# Altium footprint library IC.PcbLib: 108 footprints (part 4 of 8)
Each footprint in its own frame and in the unit in brackets; x right, y up, seen from the top. Pads: shape width x height; smd on the part's side, far side on the other; paste and mask are expansions set on the pad; w line width, h text height; cw(c..) or ccw(c..) is an arc to the next point about the centre after c.
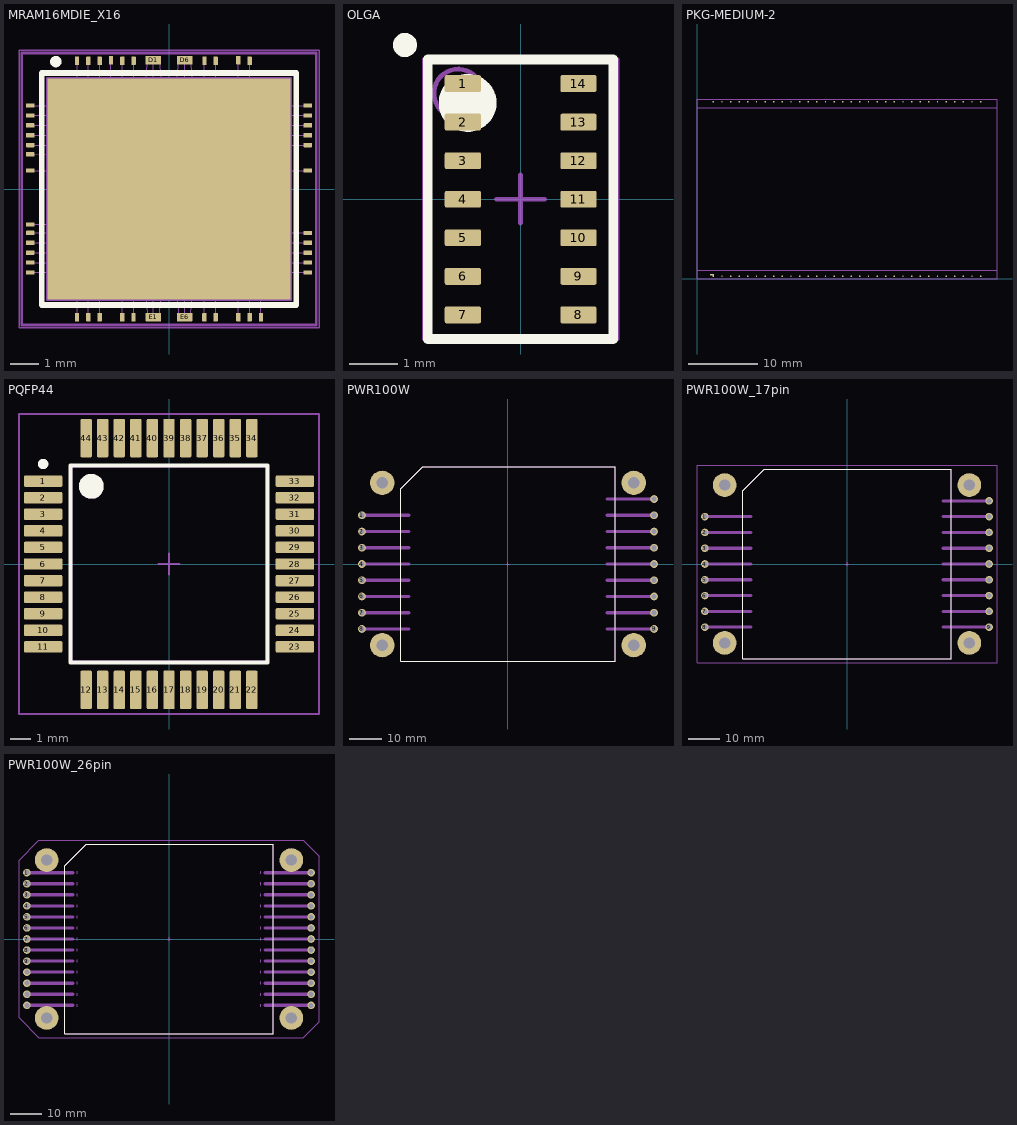
[diagram p3: the footprints below, top view; thin cyan lines are the x and y axes]

## MRAM16MDIE_X16 [mm] "MRAM16MDIE"
height 1.75
pads (201):
  rrect50% 0.15x0.15 on Mech16: 9(-3.905,-2.95) 9(-3.905,-2.6) 9(-3.905,-2.25) 9(-3.905,-1.9) 9(-3.905,-1.55) 9(-3.905,-1.25) 9(-3.905,-0.95) 9(-3.905,-0.65) 9(-3.905,-0.35) 9(-3.905,0.35) 9(-3.905,0.65) 9(-3.905,0.95) 9(-3.905,1.25) 9(-3.905,1.55) 9(-3.905,1.9) 9(-3.905,2.25) 9(-3.905,2.6) 9(-3.905,2.95) 9(-3.25,-3.53) 9(-3.25,3.53) 9(-2.85,-3.53) 9(-2.85,3.53) 9(-2.45,-3.53) 9(-2.45,3.53) 9(-2.05,-3.53) 9(-2.05,3.53) 9(-1.65,-3.53) 9(-1.65,3.53) 9(-1.25,-3.53) 9(-1.25,3.53) 9(-0.85,-3.53) 9(-0.85,3.53) 9(-0.55,-3.53) 9(-0.55,3.53) 9(-0.25,-3.53) 9(-0.25,3.53) 9(0.25,-3.53) 9(0.25,3.53) 9(0.55,-3.53) 9(0.55,3.53) 9(0.85,-3.53) 9(0.85,3.53) 9(1.25,-3.53) 9(1.25,3.53) 9(1.65,-3.53) 9(1.65,3.53) 9(2.05,-3.53) 9(2.05,3.53) 9(2.45,-3.53) 9(2.45,3.53) 9(2.85,-3.53) 9(2.85,3.53) 9(3.25,-3.53) 9(3.25,3.53) 9(3.905,-2.95) 9(3.905,-2.6) 9(3.905,-2.25) 9(3.905,-1.9) 9(3.905,-1.55) 9(3.905,-1.25) 9(3.905,-0.95) 9(3.905,-0.65) 9(3.905,-0.35) 9(3.905,0.35) 9(3.905,0.65) 9(3.905,0.95) 9(3.905,1.25) 9(3.905,1.55) 9(3.905,1.9) 9(3.905,2.25) 9(3.905,2.6) 9(3.905,2.95)
  rrect20% 0.15x0.3 smd paste-0.15: A1(-3.25,4.529) B1(2.85,4.529) B5(-3.25,-4.53) B6(-2.85,-4.53) C1(2.45,4.55) C2(1.65,4.529) C5(-2.45,-4.529) C6(-1.65,-4.53) D1(-0.75,4.55) D1(-0.35,4.55) D2(1.25,4.529) D5(-1.25,-4.53) D6(0.35,4.55) D6(0.75,4.55) E1(-0.75,-4.525) E1(-0.35,-4.525) E2(-1.25,4.529) E5(1.25,-4.529) E6(0.35,-4.525) E6(0.75,-4.525) F1(-2.45,4.529) F2(-2.05,4.55) F2(-1.65,4.529) F5(1.65,-4.529) F6(2.45,-4.53) G1(-2.85,4.529) G5(3.25,-4.53) G6(2.85,-4.529)
  rrect20% 0.3x0.15 smd paste-0.15: A2(-4.905,2.6) A3(-4.905,-1.55) A4(-4.905,-1.9) A5(-4.905,-2.25) B3(-4.905,-2.6) B4(-4.905,-2.95) C3(4.904,-2.95) C4(4.909,-2.6) D3(-4.905,1.55) D4(4.904,-2.25) E4(-4.905,1.9) E6(-4.905,0.65) E6(4.905,0.65) F3(4.904,2.95) F4(-4.905,2.25) G3(4.904,2.25) G4(4.9,2.6) H1(-4.905,1.226) H2(4.904,-1.9) H3(4.904,-1.55) H4(4.904,1.55) H5(4.904,1.9) H6(-4.9,-1.25)
  rrect20% 0.3x0.15 smd: B2(-4.905,2.95)
  rrect20% 0.45x0.3 smd paste-0.15: D1(-0.55,4.55) D6(0.55,4.55) E1(-0.55,-4.525) E6(0.55,-4.525)
  rrect25% 0.12x0.12 on Mech13: ""(-3.909,2.6) ""(-3.905,-2.95) ""(-3.905,-2.25) ""(-3.905,-1.9) ""(-3.905,-1.55) ""(-3.905,-1.25) ""(-3.905,-0.95) ""(-3.905,-0.65) ""(-3.905,-0.35) ""(-3.905,0.35) ""(-3.905,0.65) ""(-3.905,0.95) ""(-3.905,1.25) ""(-3.905,1.55) ""(-3.905,1.9) ""(-3.905,2.25) ""(-3.905,2.95) ""(-3.9,-2.6) ""(-3.25,-3.53) ""(-3.25,3.53) ""(-2.85,-3.53) ""(-2.85,3.53) ""(-2.45,-3.53) ""(-2.45,3.53) ""(-2.05,-3.53) ""(-2.05,3.53) ""(-1.65,-3.53) ""(-1.65,3.53) ""(-1.25,-3.53) ""(-1.25,3.53) ""(-0.85,-3.53) ""(-0.85,3.53) ""(-0.55,-3.53) ""(-0.55,3.53) ""(-0.25,-3.53) ""(-0.25,3.53) ""(0.25,-3.53) ""(0.25,3.53) ""(0.55,-3.53) ""(0.55,3.53) ""(0.85,-3.53) ""(0.85,3.53) ""(1.25,-3.53) ""(1.25,3.53) ""(1.65,-3.53) ""(1.65,3.53) ""(2.05,-3.53) ""(2.05,3.53) ""(2.45,-3.53) ""(2.45,3.53) ""(2.85,-3.53) ""(2.85,3.53) ""(3.25,-3.53) ""(3.25,3.53) ""(3.9,2.6) ""(3.905,-2.95) ""(3.905,-2.25) ""(3.905,-1.9) ""(3.905,-1.55) ""(3.905,-1.25) ""(3.905,-0.95) ""(3.905,-0.65) ""(3.905,-0.35) ""(3.905,0.35) ""(3.905,0.65) ""(3.905,0.95) ""(3.905,1.25) ""(3.905,1.55) ""(3.905,1.9) ""(3.905,2.25) ""(3.905,2.95) ""(3.909,-2.6)
  rect 8.6x7.8 smd: ""(0,0)
Top Overlay:
  circle w0.2: c-4,4.5 r0.1
  lines w0.2: -4.5,-4.1 4.5,-4.1 4.5,4.1 -4.5,4.1 -4.5,-4.1
M3_comm_top:
  text ".comment" at 0,0 h1
M5_asm_top:
  circle w0.15: c-4,4.5 r0.1
  lines w0.1: -4.5,-4.1 -4.5,4.1 4.5,4.1 4.5,-4.1 -4.5,-4.1
  text ".Designator" at -2,5 h1
M7_courtyard_top:
  lines w0.1: -0.5,0 0.5,0 ; 0,-0.5 0,0.5 ; -5.2,-4.8 -5.2,4.8 5.2,4.8 5.2,-4.8 -5.2,-4.8
Mechanical 13:
  circle w0.1: c-4,3.6 r0.1
  lines w0.01: -4.905,-2.95 -3.91,-2.95 ; -4.905,-2.6 -3.91,-2.6 ; -4.905,-2.25 -3.91,-2.25 ; -4.905,-1.902 -3.91,-1.902 ; -4.905,-1.55 -3.91,-1.55 ; -4.905,-1.25 -3.91,-1.25 ; -4.905,0.65 -3.91,0.65 ; -4.905,1.9 -3.91,1.9 ; -4.905,2.6 -3.91,2.6 ; -4.905,2.95 -3.91,2.95 ; -4.9,1.55 -3.905,1.55 ; -4.9,2.25 -3.905,2.25 ; -4.89,1.226 -3.905,1.243 ; -3.25,-4.53 -3.25,-3.53 ; -3.25,3.529 -3.25,4.529 ; -2.85,-4.53 -2.85,-3.53 ; -2.85,3.529 -2.85,4.529 ; -2.45,-4.529 -2.45,-3.529 ; -2.45,3.529 -2.45,4.529 ; -2.05,3.53 -2.05,4.55 ; -1.65,-4.529 -1.65,-3.529 ; -1.65,3.529 -1.65,4.529 ; -1.25,-4.529 -1.25,-3.529 ; -1.25,3.529 -1.25,4.529 ; -0.85,-3.53 -0.75,-4.525 ; -0.85,3.53 -0.75,4.55 ; -0.55,-4.53 -0.55,-3.53 ; -0.55,3.53 -0.55,4.55 ; -0.35,-4.525 -0.25,-3.53 ; -0.35,4.55 -0.25,3.53 ; 0.25,-3.53 0.35,-4.525 ; 0.25,3.53 0.35,4.55 ; 0.55,-4.53 0.55,-3.53 ; 0.55,3.53 0.55,4.55 ; 0.75,-4.525 0.85,-3.53 ; 0.75,4.55 0.85,3.53 ; 1.25,-4.529 1.25,-3.529 ; 1.25,3.529 1.25,4.529 ; 1.65,-4.529 1.65,-3.529 ; 1.65,3.529 1.65,4.529 ; 2.45,-4.53 2.45,-3.53 ; 2.45,3.53 2.45,4.55 ; 2.85,-4.529 2.85,-3.529 ; 2.85,3.529 2.85,4.529 ; 3.25,-4.53 3.25,-3.53 ; 3.899,2.6 4.9,2.6 ; 3.904,-2.95 4.904,-2.95 ; 3.904,-2.25 4.904,-2.25 ; 3.904,-1.9 4.904,-1.9 ; 3.904,-1.55 4.904,-1.55 ; 3.905,0.65 4.905,0.65 ; 3.904,1.55 4.904,1.55 ; 3.904,1.9 4.904,1.9 ; 3.904,2.25 4.904,2.25 ; 3.904,2.95 4.904,2.95 ; 3.909,-2.6 4.909,-2.6 ; -1.175,1.325 -1.175,1.6 1.175,1.6 1.175,1.325 ; -1.175,1.325 -1.175,0.65 1.175,0.65 1.175,1.325 ; -1.175,1.325 1.175,1.325
  lines w0.1: -4.3,-3.9 4.3,-3.9 4.3,3.9 -4.3,3.9 -4.3,-3.9
  text "dq" at 1.7,-3.454 h0.2
  text "dq" at 2.9,-3.429 h0.2
  text "dq" at 2.5,-3.429 h0.2
  text "dq" at 2.9,3.175 h0.2
  text "dq" at 2.5,3.176 h0.2
  text "dq" at 1.7,3.176 h0.2
  text "dq" at 1.3,3.175 h0.2
  text "dq" at -1.6,3.175 h0.2
  text "dql1" at -2.4,-3.45 h0.2
  text "dq" at -2.8,-3.45 h0.2
  text "X16" at 0.325,1.15 h0.2
  text "X8 BGA" at 0.325,0.95 h0.2
  text "X8 TSOP" at 0.325,0.75 h0.2
  text "1" at -0.85,0.75 h0.2
  text "0" at -0.175,0.75 h0.2
  text "0" at -0.85,0.95 h0.2
  text "1" at -0.175,0.95 h0.2
  text "0" at -0.85,1.15 h0.2
  text "0" at -0.175,1.15 h0.2
  text "bgax8" at -0.375,1.4 h0.2
  text "tsopx8" at -1.05,1.4 h0.2
  text "vddl" at -2,-3.45 h0.2
  text "ce2b" at -3.824,-1 h0.2
  text "nc_left1" at -3.824,-0.7 h0.2
  text "nc_left0" at -3.824,-0.4 h0.2
  text "vss_x8bga" at -3.824,0.3 h0.2
  text "vdd_x8bga" at -3.824,0.9 h0.2
  text "9" at -3.275,3.625 h0.2
  text "vdd" at 0.9,3.175 h0.2
  text "vdd" at 0.6,3.175 h0.2
  text "vdd" at 0.3,3.175 h0.2
  text "a14" at 3.525,2.875 h0.2
  text "a13" at 3.525,2.525 h0.2
  text "a12" at 3.525,2.175 h0.2
  text "a11" at 3.525,1.825 h0.2
  text "a10" at 3.525,1.475 h0.2
  text "vss" at 0.9,-3.45 h0.2
  text "vss" at 0.6,-3.45 h0.2
  text "vss" at 0.3,-3.45 h0.2
  text "vdd" at -0.2,-3.45 h0.2
  text "vdd" at -0.5,-3.45 h0.2
  text "vdd" at -0.8,-3.45 h0.2
  text "dq" at -1.2,-3.45 h0.2
  text "dq" at -1.6,-3.45 h0.2
  text "en" at -3.2,-3.45 h0.2
  text "a4" at -3.825,-3 h0.2
  text "a3" at -3.825,-2.65 h0.2
  text "a2" at -3.825,-2.3 h0.2
  text "a1" at -3.825,-1.95 h0.2
  text "a0" at -3.825,-1.6 h0.2
  text "a19" at -3.825,-1.3 h0.2
  text "bgax8" at -3.825,0.6 h0.2
  text "a18" at -3.825,1.2 h0.2
  text "a17" at -3.825,1.5 h0.2
  text "a16" at -3.825,1.85 h0.2
  text "a15" at -3.825,2.2 h0.2
  text "ng" at -3.825,2.55 h0.2
  text "dq" at -2.8,3.175 h0.2
  text "vss" at -0.2,3.175 h0.2
  text "vss" at -0.5,3.175 h0.2
  text "vss" at -0.8,3.175 h0.2
  text "dq" at -1.2,3.175 h0.2
  text "dq" at -2.4,3.175 h0.2
  text "dq" at 1.3,-3.45 h0.2
  text "w" at 3.3,-3.45 h0.2
  text "a5" at 3.625,-3.025 h0.2
  text "a6" at 3.625,-2.675 h0.2
  text "a7" at 3.625,-2.325 h0.2
  text "a8" at 3.625,-1.975 h0.2
  text "a9" at 3.625,-1.625 h0.2
  text "tsopx8" at 3.275,0.6 h0.2
  text "1" at -0.275,3.625 h0.2
  text "2" at -0.575,3.625 h0.2
  text "3" at -0.875,3.625 h0.2
  text "4" at -1.275,3.625 h0.2
  text "5" at -1.675,3.625 h0.2
  text "6" at -2.075,3.625 h0.2
  text "7" at -2.475,3.625 h0.2
  text "8" at -2.875,3.625 h0.2
  text "10" at -4.175,2.875 h0.2
  text "11" at -4.175,2.525 h0.2
  text "12" at -4.175,2.175 h0.2
  text "13" at -4.175,1.825 h0.2
  text "14" at -4.175,1.475 h0.2
  text "15" at -4.175,1.175 h0.2
  text "16" at -4.175,0.875 h0.2
  text "17" at -4.175,0.575 h0.2
  text "18" at -4.175,0.275 h0.2
  text "19" at -4.175,-0.425 h0.2
  text "20" at -4.175,-0.725 h0.2
  text "21" at -4.175,-1.025 h0.2
  text "22" at -4.175,-1.325 h0.2
  text "23" at -4.175,-1.625 h0.2
  text "24" at -4.175,-1.975 h0.2
  text "25" at -4.175,-2.325 h0.2
  text "26" at -4.175,-2.675 h0.2
  text "27" at -4.175,-3.025 h0.2
  text "28" at -3.345,-3.75 h0.2
  text "29" at -2.945,-3.75 h0.2
  text "30" at -2.545,-3.75 h0.2
  text "31" at -2.145,-3.75 h0.2
  text "32" at -1.745,-3.75 h0.2
  text "33" at -1.345,-3.75 h0.2
  text "34" at -0.945,-3.75 h0.2
  text "35" at -0.645,-3.75 h0.2
  text "36" at -0.345,-3.75 h0.2
  text "37" at 0.155,-3.75 h0.2
  text "38" at 0.455,-3.75 h0.2
  text "39" at 0.755,-3.75 h0.2
  text "40" at 1.155,-3.75 h0.2
  text "41" at 1.555,-3.75 h0.2
  text "42" at 1.955,-3.75 h0.2
  text "43" at 2.355,-3.75 h0.2
  text "44" at 2.755,-3.75 h0.2
  text "45" at 3.155,-3.75 h0.2
  text "46" at 4,-3.025 h0.2
  text "47" at 4,-2.675 h0.2
  text "48" at 4,-2.325 h0.2
  text "49" at 4,-1.975 h0.2
  text "50" at 4,-1.625 h0.2
  text "51" at 4,-1.325 h0.2
  text "52" at 4,-1.025 h0.2
  text "53" at 4,-0.725 h0.2
  text "54" at 4,-0.425 h0.2
  text "55" at 4,0.275 h0.2
  text "56" at 4,0.575 h0.2
  text "57" at 4,0.875 h0.2
  text "58" at 4,1.175 h0.2
  text "59" at 4,1.475 h0.2
  text "60" at 4,1.825 h0.2
  text "61" at 4,2.175 h0.2
  text "62" at 4,2.525 h0.2
  text "63" at 4,2.875 h0.2
  text "72" at 0.15,3.625 h0.2
  text "71" at 0.45,3.625 h0.2
  text "70" at 0.75,3.625 h0.2
  text "69" at 1.15,3.625 h0.2
  text "68" at 1.55,3.625 h0.2
  text "67" at 1.95,3.625 h0.2
  text "66" at 2.35,3.625 h0.2
  text "65" at 2.75,3.625 h0.2
  text "64" at 3.15,3.625 h0.2
  text "slp" at -2,3.175 h0.2
  text "nUB" at -3.82,2.9 h0.2
  text "nLB" at -3.2,3.15 h0.2
  text "nc_bot" at 2.1,-3.45 h0.2
  text "dbd_b_DC(/ED)" at 2.55,-1.3 h0.2
  text "lvl" at 3.625,-1.025 h0.2
  text "vdd_bot" at 3.175,-0.7 h0.2
  text "opt_bot" at 3.175,-0.4 h0.2
  text "vdd_x8tsop" at 2.9,0.3 h0.2
  text "vss_tsopx8" at 2.899,0.915 h0.2
  text "nc_right" at 3.175,1.2 h0.2
  text "vddl" at 2.1,3.125 h0.2
Mechanical 15:
  lines w0.05: -5.3,-4.9 -5.3,4.9 5.3,4.9 5.3,-4.9 -5.3,-4.9
  lines w0.1: -0.5,0 0.5,0 ; 0,-0.5 0,0.5
3D body: height 0.5, standoff 0.46, extent -4.914,0.635 -4.884,0.665
3D body: height 0.48, standoff 0, extent -4.914,0.635 -4.885,0.665
3D body: height 0.5, standoff 0.47, extent -4.9,0.635 -3.85,0.665
3D body: height 0.48, standoff 0, extent -3.265,4.514 -3.235,4.544
3D body: height 0.5, standoff 0.46, extent -3.265,4.514 -3.235,4.544
3D body: height 0.5, standoff 0.47, extent -3.265,3.53 -3.235,4.53
3D body: height 0.48, standoff 0, extent -2.865,4.514 -2.835,4.544
3D body: height 0.5, standoff 0.46, extent -2.865,4.514 -2.835,4.544
3D body: height 0.5, standoff 0.47, extent -2.865,3.53 -2.835,4.53
3D body: height 0.48, standoff 0, extent -2.465,4.514 -2.435,4.544
3D body: height 0.5, standoff 0.46, extent -2.465,4.514 -2.435,4.544
3D body: height 0.5, standoff 0.47, extent -2.465,3.53 -2.435,4.53
3D body: height 0.48, standoff 0, extent -1.665,4.514 -1.635,4.544
3D body: height 0.5, standoff 0.46, extent -1.665,4.514 -1.635,4.544
3D body: height 0.5, standoff 0.47, extent -1.665,3.53 -1.635,4.53
3D body: height 0.48, standoff 0, extent -1.265,4.514 -1.235,4.544
3D body: height 0.5, standoff 0.46, extent -1.265,4.514 -1.235,4.544
3D body: height 0.5, standoff 0.47, extent -1.265,3.53 -1.235,4.53
3D body: height 0.48, standoff 0, extent 1.235,4.514 1.265,4.544
3D body: height 0.5, standoff 0.46, extent 1.235,4.514 1.265,4.544
3D body: height 0.5, standoff 0.47, extent 1.235,3.53 1.265,4.53
3D body: height 0.48, standoff 0, extent 1.635,4.514 1.665,4.544
3D body: height 0.5, standoff 0.46, extent 1.635,4.514 1.665,4.544
3D body: height 0.5, standoff 0.47, extent 1.635,3.53 1.665,4.53
3D body: height 0.48, standoff 0, extent 2.835,4.514 2.865,4.544
3D body: height 0.5, standoff 0.46, extent 2.835,4.514 2.865,4.544
3D body: height 0.5, standoff 0.47, extent 2.835,3.53 2.865,4.53
3D body: height 0.48, standoff 0, extent 4.889,2.935 4.919,2.965
3D body: height 0.5, standoff 0.46, extent 4.889,2.935 4.919,2.965
3D body: height 0.5, standoff 0.47, extent 3.905,2.935 4.905,2.965
3D body: height 0.48, standoff 0, extent 4.885,2.585 4.915,2.615
3D body: height 0.5, standoff 0.46, extent 4.885,2.585 4.915,2.615
3D body: height 0.5, standoff 0.47, extent 3.9,2.585 4.9,2.615
3D body: height 0.48, standoff 0, extent 4.889,2.235 4.919,2.265
3D body: height 0.5, standoff 0.46, extent 4.889,2.235 4.919,2.265
3D body: height 0.5, standoff 0.47, extent 3.905,2.235 4.905,2.265
3D body: height 0.48, standoff 0, extent 4.889,1.885 4.919,1.915
3D body: height 0.5, standoff 0.46, extent 4.889,1.885 4.919,1.915
3D body: height 0.5, standoff 0.47, extent 3.905,1.885 4.905,1.915
3D body: height 0.48, standoff 0, extent 4.889,1.535 4.919,1.565
3D body: height 0.5, standoff 0.46, extent 4.889,1.535 4.919,1.565
3D body: height 0.5, standoff 0.47, extent 3.905,1.535 4.905,1.565
3D body: height 0.48, standoff 0, extent 4.889,-1.565 4.919,-1.535
3D body: height 0.5, standoff 0.46, extent 4.889,-1.565 4.919,-1.535
3D body: height 0.5, standoff 0.47, extent 3.905,-1.565 4.905,-1.535
3D body: height 0.48, standoff 0, extent 4.889,-1.915 4.919,-1.885
3D body: height 0.5, standoff 0.46, extent 4.889,-1.915 4.919,-1.885
3D body: height 0.5, standoff 0.47, extent 3.905,-1.915 4.905,-1.885
3D body: height 0.48, standoff 0, extent 4.889,-2.265 4.919,-2.235
3D body: height 0.5, standoff 0.46, extent 4.889,-2.265 4.919,-2.235
3D body: height 0.5, standoff 0.47, extent 3.905,-2.265 4.905,-2.235
3D body: height 0.48, standoff 0, extent 4.894,-2.615 4.924,-2.585
3D body: height 0.5, standoff 0.46, extent 4.894,-2.615 4.924,-2.585
3D body: height 0.5, standoff 0.47, extent 3.909,-2.615 4.909,-2.585
3D body: height 0.48, standoff 0, extent 4.889,-2.965 4.919,-2.935
3D body: height 0.5, standoff 0.46, extent 4.889,-2.965 4.919,-2.935
3D body: height 0.5, standoff 0.47, extent 3.905,-2.965 4.905,-2.935
3D body: height 0.48, standoff 0, extent 2.835,-4.544 2.865,-4.514
3D body: height 0.5, standoff 0.46, extent 2.835,-4.544 2.865,-4.514
3D body: height 0.5, standoff 0.47, extent 2.835,-4.53 2.865,-3.53
3D body: height 0.48, standoff 0, extent 1.235,-4.544 1.265,-4.514
3D body: height 0.5, standoff 0.46, extent 1.235,-4.544 1.265,-4.514
3D body: height 0.5, standoff 0.47, extent 1.235,-4.53 1.265,-3.53
3D body: height 0.48, standoff 0, extent 1.635,-4.544 1.665,-4.514
3D body: height 0.5, standoff 0.46, extent 1.635,-4.544 1.665,-4.514
3D body: height 0.5, standoff 0.47, extent 1.635,-4.53 1.665,-3.53
3D body: height 0.48, standoff 0, extent -1.265,-4.544 -1.235,-4.514
3D body: height 0.5, standoff 0.46, extent -1.265,-4.544 -1.235,-4.514
3D body: height 0.5, standoff 0.47, extent -1.265,-4.53 -1.235,-3.53
3D body: height 0.48, standoff 0, extent -1.665,-4.544 -1.635,-4.514
3D body: height 0.5, standoff 0.46, extent -1.665,-4.544 -1.635,-4.514
3D body: height 0.5, standoff 0.47, extent -1.665,-4.53 -1.635,-3.53
3D body: height 0.48, standoff 0, extent -2.465,-4.544 -2.435,-4.514
3D body: height 0.5, standoff 0.46, extent -2.465,-4.544 -2.435,-4.514
3D body: height 0.5, standoff 0.47, extent -2.465,-4.53 -2.435,-3.53
3D body: height 0.5, standoff 0.47, extent -2.865,-4.53 -2.835,-3.53
3D body: height 0.5, standoff 0.46, extent -2.865,-4.545 -2.835,-4.515
3D body: height 0.48, standoff 0, extent -2.865,-4.545 -2.835,-4.515
3D body: height 0.5, standoff 0.46, extent -4.915,-2.965 -4.885,-2.935
3D body: height 0.48, standoff 0, extent -4.915,-2.965 -4.885,-2.935
3D body: height 0.5, standoff 0.47, extent -4.9,-2.965 -3.85,-2.935
3D body: height 0.5, standoff 0.46, extent -4.915,-2.615 -4.885,-2.585
3D body: height 0.48, standoff 0, extent -4.915,-2.615 -4.885,-2.585
3D body: height 0.5, standoff 0.47, extent -4.9,-2.615 -3.85,-2.585
3D body: height 0.5, standoff 0.46, extent -4.915,-2.265 -4.885,-2.235
3D body: height 0.48, standoff 0, extent -4.915,-2.265 -4.885,-2.235
3D body: height 0.5, standoff 0.47, extent -4.9,-2.265 -3.85,-2.235
3D body: height 0.5, standoff 0.46, extent -4.915,-1.917 -4.885,-1.887
3D body: height 0.48, standoff 0, extent -4.915,-1.917 -4.885,-1.887
3D body: height 0.5, standoff 0.47, extent -4.9,-1.917 -3.85,-1.887
3D body: height 0.5, standoff 0.46, extent -4.915,-1.565 -4.885,-1.535
3D body: height 0.48, standoff 0, extent -4.915,-1.565 -4.885,-1.535
3D body: height 0.5, standoff 0.47, extent -4.9,-1.565 -3.85,-1.535
3D body: height 0.5, standoff 0.46, extent -4.915,-1.265 -4.885,-1.235
3D body: height 0.48, standoff 0, extent -4.915,-1.265 -4.885,-1.235
3D body: height 0.5, standoff 0.47, extent -4.9,-1.265 -3.85,-1.235
3D body: height 0.5, standoff 0.47, extent -4.906,1.535 -3.856,1.565
3D body: height 0.48, standoff 0, extent -4.92,1.535 -4.89,1.565
3D body: height 0.5, standoff 0.46, extent -4.92,1.535 -4.89,1.565
3D body: height 0.5, standoff 0.47, extent -4.906,1.885 -3.856,1.915
3D body: height 0.48, standoff 0, extent -4.92,1.885 -4.89,1.915
3D body: height 0.5, standoff 0.46, extent -4.92,1.885 -4.89,1.915
3D body: height 0.5, standoff 0.47, extent -4.906,2.235 -3.856,2.265
3D body: height 0.48, standoff 0, extent -4.92,2.235 -4.89,2.265
3D body: height 0.5, standoff 0.46, extent -4.92,2.235 -4.89,2.265
3D body: height 0.5, standoff 0.47, extent -4.906,2.585 -3.856,2.615
3D body: height 0.48, standoff 0, extent -4.92,2.585 -4.89,2.615
3D body: height 0.5, standoff 0.46, extent -4.92,2.585 -4.89,2.615
3D body: height 0.5, standoff 0.47, extent -4.906,2.935 -3.856,2.965
3D body: height 0.48, standoff 0, extent -4.92,2.935 -4.89,2.965
3D body: height 0.5, standoff 0.46, extent -4.92,2.935 -4.89,2.965
3D body: height 0.49, standoff 0.46, extent 0.735,3.504 0.875,4.552
3D body: height 0.5, standoff 0.47, extent 0.535,3.5 0.565,4.55
3D body: height 0.4, standoff 0, extent -4.3,-3.9 4.3,3.9
3D body: height 0.48, standoff 0, extent -2.065,4.535 -2.035,4.565
3D body: height 0.5, standoff 0.46, extent -2.065,4.535 -2.035,4.565
3D body: height 0.48, standoff 0, extent -0.765,4.535 -0.735,4.565
3D body: height 0.5, standoff 0.46, extent -0.765,4.535 -0.735,4.565
3D body: height 0.48, standoff 0, extent -0.565,4.535 -0.535,4.565
3D body: height 0.5, standoff 0.46, extent -0.565,4.535 -0.535,4.565
3D body: height 0.48, standoff 0, extent -0.365,4.535 -0.335,4.565
3D body: height 0.5, standoff 0.46, extent -0.365,4.535 -0.335,4.565
3D body: height 0.5, standoff 0.46, extent 0.335,4.535 0.365,4.565
3D body: height 0.48, standoff 0, extent 0.335,4.535 0.365,4.565
3D body: height 0.5, standoff 0.46, extent 0.535,4.535 0.565,4.565
3D body: height 0.48, standoff 0, extent 0.535,4.535 0.565,4.565
3D body: height 0.5, standoff 0.46, extent 0.735,4.535 0.765,4.565
3D body: height 0.48, standoff 0, extent 0.735,4.535 0.765,4.565
3D body: height 0.5, standoff 0.46, extent 2.435,4.535 2.465,4.565
3D body: height 0.48, standoff 0, extent 2.435,4.535 2.465,4.565
3D body: height 0.48, standoff 0, extent 4.89,0.635 4.92,0.665
3D body: height 0.47, standoff 0.46, extent 3.842,-3.012 3.967,-2.887
3D body: height 0.47, standoff 0.46, extent 3.847,-2.662 3.972,-2.537
3D body: height 0.47, standoff 0.46, extent 3.842,-2.312 3.967,-2.187
3D body: height 0.47, standoff 0.46, extent 3.842,-1.962 3.967,-1.837
3D body: height 0.47, standoff 0.46, extent 3.842,-1.612 3.967,-1.487
3D body: height 0.47, standoff 0.46, extent 3.842,-1.312 3.967,-1.187
3D body: height 0.47, standoff 0.46, extent 3.842,-1.012 3.967,-0.887
3D body: height 0.47, standoff 0.46, extent 3.842,-0.712 3.967,-0.587
3D body: height 0.47, standoff 0.46, extent 3.842,-0.412 3.967,-0.287
3D body: height 0.47, standoff 0.46, extent 3.842,0.288 3.967,0.413
3D body: height 0.47, standoff 0.46, extent 3.842,0.588 3.967,0.713
3D body: height 0.47, standoff 0.46, extent 3.842,0.888 3.967,1.013
3D body: height 0.47, standoff 0.46, extent 3.842,1.188 3.967,1.313
3D body: height 0.47, standoff 0.46, extent 3.842,1.488 3.967,1.613
3D body: height 0.47, standoff 0.46, extent 3.842,1.838 3.967,1.963
3D body: height 0.47, standoff 0.46, extent 3.842,2.188 3.967,2.313
3D body: height 0.47, standoff 0.46, extent 3.838,2.538 3.963,2.663
3D body: height 0.47, standoff 0.46, extent 3.842,2.888 3.967,3.013
3D body: height 0.47, standoff 0.46, extent 3.188,3.467 3.313,3.592
3D body: height 0.47, standoff 0.46, extent 2.788,3.467 2.913,3.592
3D body: height 0.47, standoff 0.46, extent 2.388,3.467 2.513,3.592
3D body: height 0.47, standoff 0.46, extent 1.988,3.467 2.113,3.592
3D body: height 0.47, standoff 0.46, extent 1.588,3.467 1.713,3.592
3D body: height 0.47, standoff 0.46, extent 1.188,3.467 1.313,3.592
3D body: height 0.47, standoff 0.46, extent 0.788,3.467 0.913,3.592
3D body: height 0.47, standoff 0.46, extent 0.488,3.467 0.613,3.592
3D body: height 0.47, standoff 0.46, extent 0.188,3.467 0.313,3.592
3D body: height 0.47, standoff 0.46, extent -0.312,3.467 -0.187,3.592
3D body: height 0.47, standoff 0.46, extent -0.612,3.467 -0.487,3.592
3D body: height 0.47, standoff 0.46, extent -0.912,3.467 -0.787,3.592
3D body: height 0.47, standoff 0.46, extent -1.312,3.467 -1.187,3.592
3D body: height 0.47, standoff 0.46, extent -1.712,3.467 -1.587,3.592
3D body: height 0.47, standoff 0.46, extent -3.312,3.467 -3.187,3.592
3D body: height 0.47, standoff 0.46, extent -2.512,3.467 -2.387,3.592
3D body: height 0.47, standoff 0.46, extent -2.912,3.467 -2.787,3.592
3D body: height 0.47, standoff 0.46, extent -2.112,3.467 -1.987,3.592
3D body: height 0.47, standoff 0.46, extent -3.967,2.888 -3.842,3.013
3D body: height 0.47, standoff 0.46, extent -3.972,2.538 -3.847,2.663
3D body: height 0.47, standoff 0.46, extent -3.967,2.188 -3.842,2.313
3D body: height 0.47, standoff 0.46, extent -3.967,1.838 -3.842,1.963
3D body: height 0.47, standoff 0.46, extent -3.967,1.488 -3.842,1.613
3D body: height 0.47, standoff 0.46, extent -3.967,1.188 -3.842,1.313
3D body: height 0.47, standoff 0.46, extent -3.967,0.888 -3.842,1.013
3D body: height 0.47, standoff 0.46, extent -3.967,0.588 -3.842,0.713
3D body: height 0.47, standoff 0.46, extent -3.967,0.288 -3.842,0.413
3D body: height 0.47, standoff 0.46, extent -3.967,-0.412 -3.842,-0.287
3D body: height 0.47, standoff 0.46, extent -3.967,-0.712 -3.842,-0.587
3D body: height 0.47, standoff 0.46, extent -3.967,-1.012 -3.842,-0.887
3D body: height 0.47, standoff 0.46, extent -3.967,-1.312 -3.842,-1.187
3D body: height 0.47, standoff 0.46, extent -3.967,-1.612 -3.842,-1.487
3D body: height 0.47, standoff 0.46, extent -3.967,-1.962 -3.842,-1.837
3D body: height 0.47, standoff 0.46, extent -3.967,-2.312 -3.842,-2.187
3D body: height 0.47, standoff 0.46, extent -3.967,-2.662 -3.842,-2.537
3D body: height 0.47, standoff 0.46, extent -3.967,-3.012 -3.842,-2.887
3D body: height 0.47, standoff 0.46, extent -3.312,-3.592 -3.187,-3.467
3D body: height 0.47, standoff 0.46, extent -2.912,-3.592 -2.787,-3.467
3D body: height 0.47, standoff 0.46, extent -2.512,-3.592 -2.387,-3.467
3D body: height 0.47, standoff 0.46, extent -2.112,-3.592 -1.987,-3.467
3D body: height 0.47, standoff 0.46, extent -1.712,-3.592 -1.587,-3.467
3D body: height 0.47, standoff 0.46, extent -1.312,-3.592 -1.187,-3.467
3D body: height 0.47, standoff 0.46, extent -0.912,-3.592 -0.787,-3.467
3D body: height 0.47, standoff 0.46, extent -0.612,-3.592 -0.487,-3.467
3D body: height 0.47, standoff 0.46, extent -0.312,-3.592 -0.187,-3.467
3D body: height 0.47, standoff 0.46, extent 0.188,-3.592 0.313,-3.467
3D body: height 0.47, standoff 0.46, extent 0.488,-3.592 0.613,-3.467
3D body: height 0.47, standoff 0.46, extent 0.788,-3.592 0.913,-3.467
3D body: height 0.47, standoff 0.46, extent 1.188,-3.592 1.313,-3.467
3D body: height 0.47, standoff 0.46, extent 1.588,-3.592 1.713,-3.467
3D body: height 0.47, standoff 0.46, extent 1.988,-3.592 2.113,-3.467
3D body: height 0.47, standoff 0.46, extent 2.388,-3.592 2.513,-3.467
3D body: height 0.47, standoff 0.46, extent 2.788,-3.592 2.913,-3.467
3D body: height 0.47, standoff 0.46, extent 3.188,-3.592 3.313,-3.467
3D body: height 0.48, standoff 0, extent 3.235,-4.545 3.265,-4.515
3D body: height 0.48, standoff 0, extent 2.435,-4.545 2.465,-4.515
3D body: height 0.48, standoff 0, extent 0.735,-4.54 0.765,-4.51
3D body: height 0.48, standoff 0, extent 0.535,-4.545 0.565,-4.515
3D body: height 0.48, standoff 0, extent 0.335,-4.54 0.365,-4.51
3D body: height 0.48, standoff 0, extent -0.365,-4.54 -0.335,-4.51
3D body: height 0.48, standoff 0, extent -0.565,-4.545 -0.535,-4.515
3D body: height 0.48, standoff 0, extent -0.765,-4.54 -0.735,-4.51
3D body: height 0.48, standoff 0, extent -3.265,-4.545 -3.235,-4.515
3D body: height 0.48, standoff 0, extent -4.92,1.211 -4.89,1.241
3D body: height 0.5, standoff 0.46, extent -4.92,1.211 -4.89,1.241
3D body: height 0.5, standoff 0.46, extent -3.265,-4.545 -3.235,-4.515
3D body: height 0.5, standoff 0.46, extent -0.765,-4.54 -0.735,-4.51
3D body: height 0.5, standoff 0.46, extent -0.565,-4.545 -0.535,-4.515
3D body: height 0.5, standoff 0.46, extent -0.365,-4.54 -0.335,-4.51
3D body: height 0.5, standoff 0.46, extent 0.335,-4.54 0.365,-4.51
3D body: height 0.5, standoff 0.46, extent 0.535,-4.545 0.565,-4.515
3D body: height 0.5, standoff 0.46, extent 0.735,-4.54 0.765,-4.51
3D body: height 0.5, standoff 0.46, extent 2.435,-4.545 2.465,-4.515
3D body: height 0.5, standoff 0.46, extent 3.235,-4.545 3.265,-4.515
3D body: height 0.5, standoff 0.46, extent 4.89,0.635 4.92,0.665
3D body: height 0.5, standoff 0.47, extent 0.225,3.505 0.365,4.552
3D body: height 0.5, standoff 0.47, extent -0.583,3.5 -0.535,4.551
3D body: height 0.5, standoff 0.47, extent -0.365,3.503 -0.244,4.552
3D body: height 0.5, standoff 0.47, extent -0.875,3.505 -0.735,4.552
3D body: height 0.5, standoff 0.47, extent -2.065,3.5 -2.035,4.55
3D body: height 0.5, standoff 0.47, extent 2.435,3.5 2.465,4.55
3D body: height 0.5, standoff 0.47, extent 3.905,0.635 4.905,0.665
3D body: height 0.5, standoff 0.47, extent 3.235,-4.53 3.265,-3.53
3D body: height 0.5, standoff 0.47, extent 2.435,-4.53 2.465,-3.53
3D body: height 0.5, standoff 0.47, extent -3.265,-4.53 -3.235,-3.53
3D body: height 0.5, standoff 0.47, extent -4.905,1.211 -3.905,1.258
3D body: height 0.5, standoff 0.47, extent -0.869,-4.527 -0.735,-3.529
3D body: height 0.5, standoff 0.47, extent -0.565,-4.53 -0.535,-3.53
3D body: height 0.5, standoff 0.47, extent -0.365,-4.527 -0.23,-3.529
3D body: height 0.5, standoff 0.47, extent 0.535,-4.53 0.565,-3.53
3D body: height 0.5, standoff 0.47, extent 0.231,-4.527 0.365,-3.529
3D body: height 0.5, standoff 0.47, extent 0.735,-4.527 0.87,-3.529
3D body: height 0.41, standoff 0.4, extent -4.3,3.25 -3.625,3.9

## OLGA [mm] "OLGA, MAXIM, IPC Medium Density"
height 2.39
pads (14):
  rrect20% 0.75x0.35 smd: 1(-1.2,2.4) 2(-1.2,1.6) 3(-1.2,0.8) 4(-1.2,0) 5(-1.2,-0.8) 6(-1.2,-1.6) 7(-1.2,-2.4) 8(1.2,-2.4) 9(1.2,-1.6) 10(1.2,-0.8) 11(1.2,0) 12(1.2,0.8) 13(1.2,1.6) 14(1.2,2.4)
Top Overlay:
  circle w0.25: c-2.4,3.2 r0.125
  circle w0.6: c-1.1,2 r0.3
  lines w0.2: -1.925,-2.9 -1.925,2.9 1.925,2.9 1.925,-2.9 -1.925,-2.9
Mechanical 13:
  circle w0.1: c-1.3,2.2 r0.5
  lines w0.1: -2,-2.9 -2,2.9 2,2.9 2,-2.9 -2,-2.9
Mechanical 15:
  lines w0.05: -2,-2.9 -2,2.9 2,2.9 2,-2.9 -2,-2.9
  lines w0.1: -0.5,0 0.5,0 ; 0,-0.5 0,0.5
3D body: height 1.65, standoff 0.08, extent -2,-2.9 2,2.9

## PKG-MEDIUM-2 [mm]
height 0.3
pads (65):
  rect 0.4x0.2 smd paste+0 mask+0.25: 1(2.075,0.55)
  rect 0.2x0.4 smd paste+0 mask+0.25: 1(2.375,0.45)
  rect 0.2x0.2 smd paste+0 mask+0.25: 2(3.625,0.35) 3(4.875,0.35) 4(6.125,0.35) 5(7.375,0.35) 6(8.625,0.35) 7(9.875,0.35) 8(11.125,0.35) 9(12.375,0.35) 10(13.625,0.35) 11(14.875,0.35) 12(16.125,0.35) 13(17.375,0.35) 14(18.625,0.35) 15(19.875,0.35) 16(21.125,0.35) 17(22.375,0.35) 18(23.625,0.35) 19(24.875,0.35) 20(26.125,0.35) 21(27.375,0.35) 22(28.625,0.35) 23(29.875,0.35) 24(31.125,0.35) 25(32.375,0.35) 26(33.625,0.35) 27(34.875,0.35) 28(36.125,0.35) 29(37.375,0.35) 30(38.625,0.35) 31(39.875,0.35) 32(41.125,0.35) 33(41.125,25.65) 34(39.875,25.65) 35(38.625,25.65) 36(37.375,25.65) 37(36.125,25.65) 38(34.875,25.65) 39(33.625,25.65) 40(32.375,25.65) 41(31.125,25.65) 42(29.875,25.65) 43(28.625,25.65) 44(27.375,25.65) 45(26.125,25.65) 46(24.875,25.65) 47(23.625,25.65) 48(22.375,25.65) 49(21.125,25.65) 50(19.875,25.65) 51(18.625,25.65) 52(17.375,25.65) 53(16.125,25.65) 54(14.875,25.65) 55(13.625,25.65) 56(12.375,25.65) 57(11.125,25.65) 58(9.875,25.65) 59(8.625,25.65) 60(7.375,25.65) 61(6.125,25.65) 62(4.875,25.65) 63(3.625,25.65) 64(2.375,25.65)
Mechanical 15:
  lines w0.01: 0,1.2 43.5,1.2 ; 0,24.8 43.5,24.8 ; 0,0 43.5,0 43.5,26 0,26 0,0

## PQFP44 [mm] "QFP, 44-Leads, Body 10,00x10,00mm, Pitch 0,80mm, IPC Medium Density"
height 2.7
pads (44):
  rrect20% 1.85x0.55 smd: 1(-6.075,4) 2(-6.075,3.2) 3(-6.075,2.4) 4(-6.075,1.6) 5(-6.075,0.8) 6(-6.075,0) 7(-6.075,-0.8) 8(-6.075,-1.6) 9(-6.075,-2.4) 10(-6.075,-3.2) 11(-6.075,-4) 23(6.075,-4) 24(6.075,-3.2) 25(6.075,-2.4) 26(6.075,-1.6) 27(6.075,-0.8) 28(6.075,0) 29(6.075,0.8) 30(6.075,1.6) 31(6.075,2.4) 32(6.075,3.2) 33(6.075,4)
  rrect20% 0.55x1.85 smd: 12(-4,-6.075) 13(-3.2,-6.075) 14(-2.4,-6.075) 15(-1.6,-6.075) 16(-0.8,-6.075) 17(0,-6.075) 18(0.8,-6.075) 19(1.6,-6.075) 20(2.4,-6.075) 21(3.2,-6.075) 22(4,-6.075) 34(4,6.075) 35(3.2,6.075) 36(2.4,6.075) 37(1.6,6.075) 38(0.8,6.075) 39(0,6.075) 40(-0.8,6.075) 41(-1.6,6.075) 42(-2.4,6.075) 43(-3.2,6.075) 44(-4,6.075)
Top Overlay:
  circle w0.6: c-3.75,3.75 r0.3
  circle w0.25: c-6.075,4.825 r0.125
  lines w0.2: -4.75,-4.75 -4.75,4.75 4.75,4.75 4.75,-4.75 -4.75,-4.75
M3_comm_top:
  text ".comment" at -1.1,-0.3 h1
M5_asm_top:
  circle w0.6: c-3.75,3.75 r0.3
  lines w0.1: -4.699,-4.699 4.699,-4.699 4.699,4.699 -4.699,4.699 -4.699,-4.699
  text ".Designator" at -0.762,7.493 h1
M7_courtyard_top:
  lines w0.1: -0.5,0 0.5,0 ; 0,-0.5 0,0.5 ; -7.239,-7.239 7.239,-7.239 7.239,7.239 -7.239,7.239 -7.239,-7.239
3D body "TQFP44.step": height 1.03, standoff -0.04, extent -6.001,-6.039 5.999,5.961

## PWR100W [mm]
height 12.5
pads (21):
  round 2.4 hole 1.6: 1(-45,15) 2(-45,10) 3(-45,5) 4(-45,0) 5(-45,-5) 6(-45,-10) 7(-45,-15) 8(-45,-20) 9(45,-20) 10(45,-15) 11(45,-10) 12(45,-5) 13(45,0) 14(45,5) 15(45,10) 16(45,15) 17(45,20.001)
  round 7.5 hole 3.6: ""(-38.75,-25) ""(-38.75,25) ""(38.75,-25) ""(38.75,25)
Top Overlay:
  lines w0.2: -33,-30 -33,23.25 -26.25,30 33,30 33,-30 -33,-30
M3_comm_top:
  text ".comment" at -3,-0.5 h2
M5_asm_top:
  text "PIN #1" at -40,17.5 h2
  text ".Designator" at -2,5.5 h2
M6_asm_bot:
  lines w0.2: -33,-30 33,-30 33,30 -26.25,30 -33,23.25 -33,-30
  lines w1: -45,-20.001 -30.5,-20.001 ; -45,-15.001 -30.5,-15.001 ; -45,-10 -30.5,-10 ; -45,-5.001 -30.5,-5.001 ; -45,-0.001 -30.5,-0.001 ; -45,4.999 -30.5,4.999 ; -45,10 -30.5,10 ; -45,15 -30.5,15 ; 30.5,-20 45,-20 ; 30.5,-15.001 45,-15.001 ; 30.5,-10.001 45,-10.001 ; 30.5,-5.001 45,-5.001 ; 30.5,-0.001 45,-0.001 ; 30.5,4.999 45,4.999 ; 30.5,9.999 45,9.999 ; 30.5,14.999 45,14.999 ; 30.5,20.001 45,20.001
M7_courtyard_top:
  lines w0.1: -0.5,0 0.5,0 ; 0,-0.5 0,0.5
3D body: height 6.5, standoff 5.5, extent 33,19.503 45,20.501
3D body: height 6.5, standoff 5.5, extent 44.509,19.503 45.5,20.499
3D body: height 6, standoff -2, extent 44.5,19.502 45.496,20.5
3D body: height 6, standoff -2, extent 44.5,14.501 45.496,15.499
3D body: height 6.5, standoff 5.5, extent 44.509,14.502 45.5,15.498
3D body: height 6.5, standoff 5.5, extent 33,14.502 45,15.5
3D body: height 6.5, standoff 5.5, extent 33,9.502 45,10.5
3D body: height 6.5, standoff 5.5, extent 44.508,9.502 45.5,10.498
3D body: height 6, standoff -2, extent 44.5,9.501 45.496,10.499
3D body: height 6.5, standoff 5.5, extent 33,4.502 45,5.5
3D body: height 6.5, standoff 5.5, extent 44.508,4.502 45.5,5.498
3D body: height 6, standoff -2, extent 44.5,4.501 45.496,5.499
3D body: height 6.5, standoff 5.5, extent 33,-0.498 45,0.5
3D body: height 6.5, standoff 5.5, extent 44.508,-0.498 45.5,0.498
3D body: height 6, standoff -2, extent 44.5,-0.499 45.496,0.499
3D body: height 6.5, standoff 5.5, extent 33,-5.498 45,-4.5
3D body: height 6.5, standoff 5.5, extent 44.508,-5.498 45.5,-4.502
3D body: height 6, standoff -2, extent 44.5,-5.499 45.496,-4.501
3D body: height 6.5, standoff 5.5, extent 33,-10.498 45,-9.5
3D body: height 6.5, standoff 5.5, extent 44.508,-10.498 45.5,-9.502
3D body: height 6, standoff -2, extent 44.5,-10.499 45.496,-9.501
3D body: height 6, standoff -2, extent 44.5,-20.499 45.496,-19.501
3D body: height 6.5, standoff 5.5, extent 44.508,-20.498 45.5,-19.502
3D body: height 6.5, standoff 5.5, extent 33,-20.498 45,-19.5
3D body: height 6, standoff -2, extent 44.5,-15.499 45.496,-14.501
3D body: height 6.5, standoff 5.5, extent 44.508,-15.498 45.5,-14.502
3D body: height 6.5, standoff 5.5, extent 33,-15.498 45,-14.5
3D body: height 6.5, standoff 5.5, extent -45,-15.498 -33,-14.5
3D body: height 6.5, standoff 5.5, extent -45.5,-15.498 -44.508,-14.502
3D body: height 6, standoff -2, extent -45.496,-15.499 -44.5,-14.501
3D body: height 6.5, standoff 5.5, extent -45,-20.498 -33,-19.5
3D body: height 6.5, standoff 5.5, extent -45.5,-20.498 -44.508,-19.502
3D body: height 6, standoff -2, extent -45.496,-20.499 -44.5,-19.501
3D body: height 6, standoff -2, extent -45.496,-10.499 -44.5,-9.501
3D body: height 6.5, standoff 5.5, extent -45.5,-10.498 -44.508,-9.502
3D body: height 6.5, standoff 5.5, extent -45,-10.498 -33,-9.5
3D body: height 6, standoff -2, extent -45.496,-5.499 -44.5,-4.501
3D body: height 6.5, standoff 5.5, extent -45.5,-5.498 -44.508,-4.502
3D body: height 6.5, standoff 5.5, extent -45,-5.498 -33,-4.5
3D body: height 6, standoff -2, extent -45.496,-0.499 -44.5,0.499
3D body: height 6.5, standoff 5.5, extent -45.5,-0.498 -44.508,0.498
3D body: height 6.5, standoff 5.5, extent -45,-0.498 -33,0.5
3D body: height 6, standoff -2, extent -45.496,4.501 -44.5,5.499
3D body: height 6.5, standoff 5.5, extent -45.5,4.502 -44.508,5.498
3D body: height 6.5, standoff 5.5, extent -45,4.502 -33,5.5
3D body: height 6, standoff -2, extent -45.496,9.501 -44.5,10.499
3D body: height 6.5, standoff 5.5, extent -45.5,9.502 -44.508,10.498
3D body: height 6.5, standoff 5.5, extent -45,9.502 -33,10.5
3D body: height 6.5, standoff 5.5, extent -45,14.502 -33,15.5
3D body: height 6.5, standoff 5.5, extent -45.5,14.502 -44.509,15.498
3D body: height 6, standoff -2, extent -45.496,14.501 -44.5,15.499
3D body "Корпус.stp": height 10, standoff 0, extent -42.5,-30 42.5,30
3D body "M3x0_5xL Phillips Panhead Screw.step": height 3.58, standoff -2.8, extent -41.55,22.2 -35.95,27.8
3D body "M3x0_5xL Phillips Panhead Screw.step": height 3.58, standoff -2.8, extent 35.95,22.2 41.55,27.8
3D body "M3x0_5xL Phillips Panhead Screw.step": height 3.58, standoff -2.8, extent 35.95,-27.8 41.55,-22.2
3D body "M3x0_5xL Phillips Panhead Screw.step": height 3.58, standoff -2.8, extent -41.55,-27.8 -35.95,-22.2

## PWR100W_17pin [mm] "Modul CPU 17 PIN"
height 12.5
pads (21):
  round 2.4 hole 1.6: 1(-45,15) 2(-45,10) 3(-45,5) 4(-45,0) 5(-45,-5) 6(-45,-10) 7(-45,-15) 8(-45,-20) 9(45,-20) 10(45,-15) 11(45,-10) 12(45,-5) 13(45,0) 14(45,5) 15(45,10) 16(45,15) 17(45,20.001)
  round 7.5 hole 3.6: ""(-38.75,-25) ""(-38.75,25) ""(38.75,-25) ""(38.75,25)
Top Overlay:
  lines w0.2: -33,-30 -33,23.25 -26.25,30 33,30 33,-30 -33,-30
M3_comm_top:
  text ".comment" at -3,-0.5 h2
M5_asm_top:
  text "PIN #1" at -40,17.5 h2
  text ".Designator" at -2,5.5 h2
M6_asm_bot:
  lines w0.2: -33,-30 33,-30 33,30 -26.25,30 -33,23.25 -33,-30
  lines w1: -45,-20.001 -30.5,-20.001 ; -45,-15.001 -30.5,-15.001 ; -45,-10 -30.5,-10 ; -45,-5.001 -30.5,-5.001 ; -45,-0.001 -30.5,-0.001 ; -45,4.999 -30.5,4.999 ; -45,10 -30.5,10 ; -45,15 -30.5,15 ; 30.5,-20 45,-20 ; 30.5,-15.001 45,-15.001 ; 30.5,-10.001 45,-10.001 ; 30.5,-5.001 45,-5.001 ; 30.5,-0.001 45,-0.001 ; 30.5,4.999 45,4.999 ; 30.5,9.999 45,9.999 ; 30.5,14.999 45,14.999 ; 30.5,20.001 45,20.001
M7_courtyard_top:
  lines w0.1: -0.5,0 0.5,0 ; 0,-0.5 0,0.5
  lines w0.2: -47.5,-31.25 47.5,-31.25 47.5,31.25 -47.5,31.25 -47.5,-31.25
3D body: height 6.5, standoff 5.5, extent 33,19.503 45,20.501
3D body: height 6.5, standoff 5.5, extent 44.509,19.503 45.5,20.499
3D body: height 6, standoff -2, extent 44.5,19.502 45.496,20.5
3D body: height 6, standoff -2, extent 44.5,14.501 45.496,15.499
3D body: height 6.5, standoff 5.5, extent 44.509,14.502 45.5,15.498
3D body: height 6.5, standoff 5.5, extent 33,14.502 45,15.5
3D body: height 6.5, standoff 5.5, extent 33,9.502 45,10.5
3D body: height 6.5, standoff 5.5, extent 44.508,9.502 45.5,10.498
3D body: height 6, standoff -2, extent 44.5,9.501 45.496,10.499
3D body: height 6.5, standoff 5.5, extent 33,4.502 45,5.5
3D body: height 6.5, standoff 5.5, extent 44.508,4.502 45.5,5.498
3D body: height 6, standoff -2, extent 44.5,4.501 45.496,5.499
3D body: height 6.5, standoff 5.5, extent 33,-0.498 45,0.5
3D body: height 6.5, standoff 5.5, extent 44.508,-0.498 45.5,0.498
3D body: height 6, standoff -2, extent 44.5,-0.499 45.496,0.499
3D body: height 6.5, standoff 5.5, extent 33,-5.498 45,-4.5
3D body: height 6.5, standoff 5.5, extent 44.508,-5.498 45.5,-4.502
3D body: height 6, standoff -2, extent 44.5,-5.499 45.496,-4.501
3D body: height 6.5, standoff 5.5, extent 33,-10.498 45,-9.5
3D body: height 6.5, standoff 5.5, extent 44.508,-10.498 45.5,-9.502
3D body: height 6, standoff -2, extent 44.5,-10.499 45.496,-9.501
3D body: height 6, standoff -2, extent 44.5,-20.499 45.496,-19.501
3D body: height 6.5, standoff 5.5, extent 44.508,-20.498 45.5,-19.502
3D body: height 6.5, standoff 5.5, extent 33,-20.498 45,-19.5
3D body: height 6, standoff -2, extent 44.5,-15.499 45.496,-14.501
3D body: height 6.5, standoff 5.5, extent 44.508,-15.498 45.5,-14.502
3D body: height 6.5, standoff 5.5, extent 33,-15.498 45,-14.5
3D body: height 6.5, standoff 5.5, extent -45,-15.498 -33,-14.5
3D body: height 6.5, standoff 5.5, extent -45.5,-15.498 -44.508,-14.502
3D body: height 6, standoff -2, extent -45.496,-15.499 -44.5,-14.501
3D body: height 6.5, standoff 5.5, extent -45,-20.498 -33,-19.5
3D body: height 6.5, standoff 5.5, extent -45.5,-20.498 -44.508,-19.502
3D body: height 6, standoff -2, extent -45.496,-20.499 -44.5,-19.501
3D body: height 6, standoff -2, extent -45.496,-10.499 -44.5,-9.501
3D body: height 6.5, standoff 5.5, extent -45.5,-10.498 -44.508,-9.502
3D body: height 6.5, standoff 5.5, extent -45,-10.498 -33,-9.5
3D body: height 6, standoff -2, extent -45.496,-5.499 -44.5,-4.501
3D body: height 6.5, standoff 5.5, extent -45.5,-5.498 -44.508,-4.502
3D body: height 6.5, standoff 5.5, extent -45,-5.498 -33,-4.5
3D body: height 6, standoff -2, extent -45.496,-0.499 -44.5,0.499
3D body: height 6.5, standoff 5.5, extent -45.5,-0.498 -44.508,0.498
3D body: height 6.5, standoff 5.5, extent -45,-0.498 -33,0.5
3D body: height 6, standoff -2, extent -45.496,4.501 -44.5,5.499
3D body: height 6.5, standoff 5.5, extent -45.5,4.502 -44.508,5.498
3D body: height 6.5, standoff 5.5, extent -45,4.502 -33,5.5
3D body: height 6, standoff -2, extent -45.496,9.501 -44.5,10.499
3D body: height 6.5, standoff 5.5, extent -45.5,9.502 -44.508,10.498
3D body: height 6.5, standoff 5.5, extent -45,9.502 -33,10.5
3D body: height 6.5, standoff 5.5, extent -45,14.502 -33,15.5
3D body: height 6.5, standoff 5.5, extent -45.5,14.502 -44.509,15.498
3D body: height 6, standoff -2, extent -45.496,14.501 -44.5,15.499
3D body "Корпус.stp": height 10, standoff 0, extent -42.5,-30 42.5,30
3D body "M3x0_5xL Phillips Panhead Screw.step": height 3.58, standoff -2.8, extent -41.55,22.2 -35.95,27.8
3D body "M3x0_5xL Phillips Panhead Screw.step": height 3.58, standoff -2.8, extent 35.95,22.2 41.55,27.8
3D body "M3x0_5xL Phillips Panhead Screw.step": height 3.58, standoff -2.8, extent 35.95,-27.8 41.55,-22.2
3D body "M3x0_5xL Phillips Panhead Screw.step": height 3.58, standoff -2.8, extent -41.55,-27.8 -35.95,-22.2

## PWR100W_26pin [mm] "Modul CPU 26 PIN"
height 12.5
pads (30):
  round 2.4 hole 1.6: 1(-45,21.001) 2(-45,17.5) 3(-45,14.001) 4(-45,10.5) 5(-45,7.001) 6(-45,3.501) 7(-45,0) 8(-45,-3.499) 9(-45,-6.999) 10(-45,-10.5) 11(-45,-13.999) 12(-45,-17.499) 13(-45,-20.999) 14(45,-20.999) 15(45,-17.499) 16(45,-13.999) 17(45,-10.5) 18(45,-6.999) 19(45,-3.499) 20(45,0) 21(45,3.501) 22(45,7.001) 23(45,10.5) 24(45,14.001) 25(45,17.5) 26(45,21.001)
  round 7.5 hole 3.6: ""(-38.75,-25) ""(-38.75,25) ""(38.75,-25) ""(38.75,25)
Top Overlay:
  lines w0.2: -33,-30 -33,23.25 -26.25,30 33,30 33,-30 -33,-30
M3_comm_top:
  text ".comment" at -3,-0.5 h2
M5_asm_top:
  lines w0.2: -33,-30 -33,23.25 -26.25,30 33,30 33,-30 -33,-30
  lines w1: -45,-21 -30.5,-21 ; -45,-17.5 -30.5,-17.5 ; -45,-14 -30.5,-14 ; -45,-10.5 -30.5,-10.5 ; -45,-7 -30.5,-7 ; -45,-3.5 -30.5,-3.5 ; -45,-0.001 -30.5,-0.001 ; -45,3.5 -30.5,3.5 ; -45,7 -30.5,7 ; -45,10.5 -30.5,10.5 ; -45,14 -30.5,14 ; -45,17.5 -30.5,17.5 ; -45,21 -30.5,21 ; 30.5,-21 45,-21 ; 30.5,-17.5 45,-17.5 ; 30.5,-14 45,-14 ; 30.5,-10.5 45,-10.5 ; 30.5,-7 45,-7 ; 30.5,-3.5 45,-3.5 ; 30.5,-0.001 45,-0.001 ; 30.5,3.5 45,3.5 ; 30.5,7 45,7 ; 30.5,10.5 45,10.5 ; 30.5,14 45,14 ; 30.5,17.5 45,17.5 ; 30.5,21 45,21
  text "PIN #26" at 42.4,22.3 h2
  text "PIN #14" at 42.6,-23.6 h2
  text "PIN #13" at -47.4,-24 h2
  text "PIN #1" at -46.9,22.5 h2
  text ".Designator" at -2,5.5 h2
M7_courtyard_top:
  lines w0.1: -0.5,0 0.5,0 ; 0,-0.5 0,0.5
  lines w0.2: -47.5,-25 -47.5,25 -41.25,31.25 42.5,31.25 47.5,26.25 47.5,-26.25 42.5,-31.25 -41.25,-31.25 -47.5,-25
M9_board_outline:
  lines w0.2: -29,-21.406 -29,-20.606 ; -29,-17.906 -29,-17.106 ; -29,-14.406 -29,-13.606 ; -29,-10.906 -29,-10.106 ; -29,-7.406 -29,-6.606 ; -29,-3.906 -29,-3.106 ; -29,-0.406 -29,0.394 ; -29,3.094 -29,3.894 ; -29,6.594 -29,7.394 ; -29,10.094 -29,10.894 ; -29,13.594 -29,14.394 ; -29,17.094 -29,17.894 ; -29,20.594 -29,21.394 ; 29,-21.406 29,-20.606 ; 29,-17.906 29,-17.106 ; 29,-14.406 29,-13.606 ; 29,-10.906 29,-10.106 ; 29,-7.406 29,-6.606 ; 29,-3.906 29,-3.106 ; 29,-0.406 29,0.394 ; 29,3.094 29,3.894 ; 29,6.594 29,7.394 ; 29,10.094 29,10.894 ; 29,13.594 29,14.394 ; 29,17.094 29,17.894 ; 29,20.594 29,21.394
3D body "ИВЕП100В_СТЕП_формованные_вывода (1).STEP": height 13, standoff -2.69, extent -45.5,-30 45.5,30
3D body "M3x0_5xL Phillips Panhead Screw.step": height 3.58, standoff -2.8, extent -41.55,22.2 -35.95,27.8
3D body "M3x0_5xL Phillips Panhead Screw.step": height 3.58, standoff -2.8, extent 35.95,22.2 41.55,27.8
3D body "M3x0_5xL Phillips Panhead Screw.step": height 3.58, standoff -2.8, extent 35.95,-27.8 41.55,-22.2
3D body "M3x0_5xL Phillips Panhead Screw.step": height 3.58, standoff -2.8, extent -41.55,-27.8 -35.95,-22.2